# Altium footprint library 15EDGVC_VH.PcbLib: 46 footprints (part 1 of 3)
Each footprint in its own frame and in the unit in brackets; x right, y up, seen from the top. Pads: shape width x height; smd on the part's side, far side on the other; paste and mask are expansions set on the pad; w line width, h text height; cw(c..) or ccw(c..) is an arc to the next point about the centre after c.
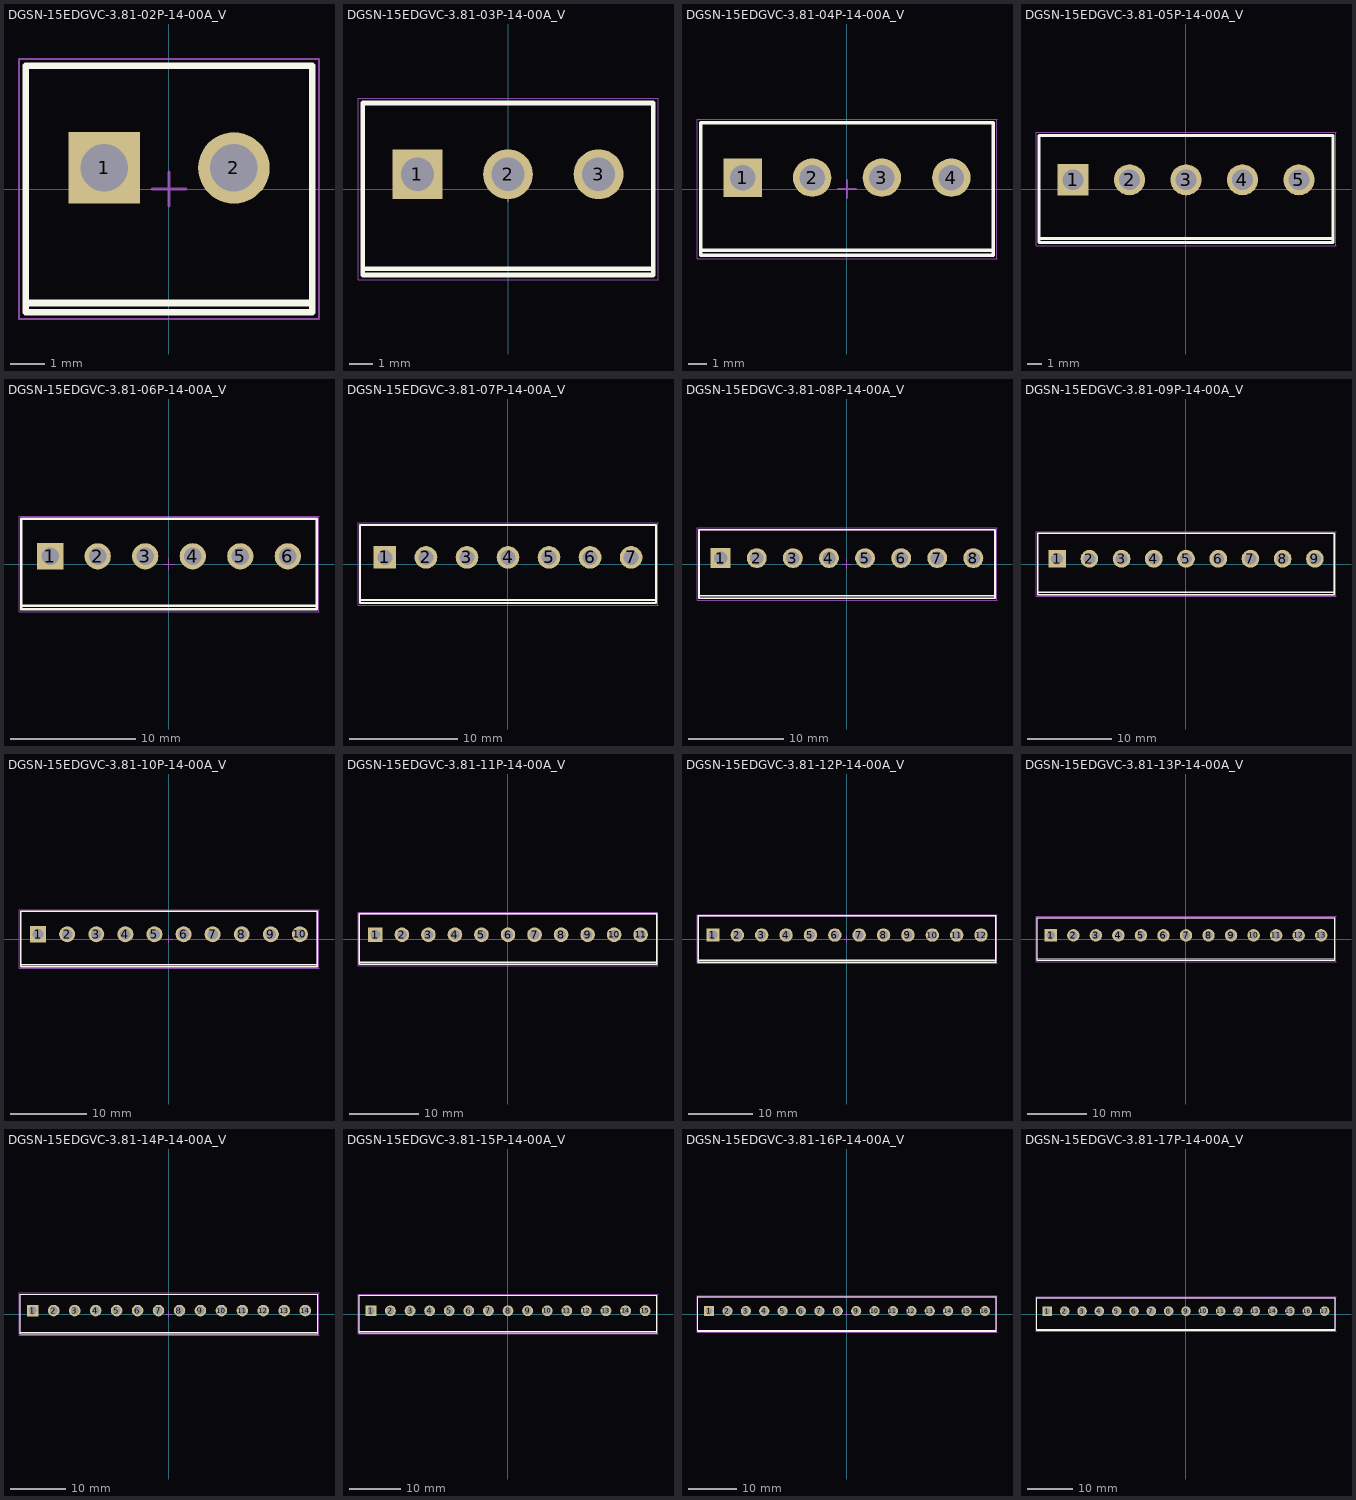
[diagram p0: the footprints below, top view; thin cyan lines are the x and y axes]

## DGSN-15EDGVC-3.81-02P-14-00A_V [mm] "Terminal Block, 2-Pin, Body 8.41x7.24mm, Pitch 3.81mm"
height 9.2
pads (2):
  rect 2.1x2.1 hole 1.4: 1(-1.905,0.62)
  round 2.1 hole 1.4: 2(1.905,0.62)
Top Overlay:
  lines w0.2: -4.205,-3.35 4.205,-3.35 ; -4.205,-3.62 -4.205,3.62 4.205,3.62 4.205,-3.62 -4.205,-3.62
Mechanical 13:
  lines w0.1: -4.205,-3.62 -4.205,3.62 4.205,3.62 4.205,-3.62 -4.205,-3.62
Mechanical 15:
  lines w0.05: -4.405,-3.82 -4.405,3.82 ; -4.405,-3.82 4.405,-3.82 4.405,3.82 -4.405,3.82
  lines w0.1: -0.5,0 0.5,0 ; 0,-0.5 0,0.5
3D body "15EDGVC-3.81-02P-14-00AH.STEP": height 9.2, standoff -3.4, extent -4.205,-3.58 4.205,3.62

## DGSN-15EDGVC-3.81-03P-14-00A_V [mm] "Terminal Block, 3-Pin, Body 12.22x7.24mm, Pitch 3.81mm"
height 9.2
pads (3):
  rect 2.1x2.1 hole 1.4: 1(-3.81,0.62)
  round 2.1 hole 1.4: 2(0,0.62) 3(3.81,0.62)
Top Overlay:
  lines w0.2: -6.11,-3.35 6.11,-3.35 ; -6.11,-3.62 6.11,-3.62 6.11,3.62 -6.11,3.62 -6.11,-3.62
Mechanical 13:
  lines w0.1: -6.11,-3.62 6.11,-3.62 6.11,3.62 -6.11,3.62 -6.11,-3.62
Mechanical 15:
  lines w0.05: -6.31,-3.82 -6.31,3.82 ; -6.31,-3.82 6.31,-3.82 6.31,3.82 -6.31,3.82
  lines w0.1: -0.5,0 0.5,0 ; 0,-0.5 0,0.5
3D body "15EDGVC-3.81-03P-14-00AH.STEP": height 9.2, standoff -3.4, extent -6.11,-3.58 6.11,3.62

## DGSN-15EDGVC-3.81-04P-14-00A_V [mm] "Terminal Block, 4-Pin, Body 16.03x7.24mm, Pitch 3.81mm"
height 9.2
pads (4):
  rect 2.1x2.1 hole 1.4: 1(-5.715,0.62)
  round 2.1 hole 1.4: 2(-1.905,0.62) 3(1.905,0.62) 4(5.715,0.62)
Top Overlay:
  lines w0.2: -8.015,-3.35 8.015,-3.35 ; -8.015,-3.62 8.015,-3.62 8.015,3.62 -8.015,3.62 -8.015,-3.62
Mechanical 13:
  lines w0.1: -8.015,-3.62 8.015,-3.62 8.015,3.62 -8.015,3.62 -8.015,-3.62
Mechanical 15:
  lines w0.05: -8.215,-3.82 -8.215,3.82 ; -8.215,-3.82 8.215,-3.82 8.215,3.82 -8.215,3.82
  lines w0.1: -0.5,0 0.5,0 ; 0,-0.5 0,0.5
3D body "15EDGVC-3.81-04P-14-00AH.STEP": height 9.2, standoff -3.4, extent -8.015,-3.58 8.015,3.62

## DGSN-15EDGVC-3.81-05P-14-00A_V [mm] "Terminal Block, 5-Pin, Body 19.84x7.24mm, Pitch 3.81mm"
height 9.2
pads (5):
  rect 2.1x2.1 hole 1.4: 1(-7.62,0.62)
  round 2.1 hole 1.4: 2(-3.81,0.62) 3(0,0.62) 4(3.81,0.62) 5(7.62,0.62)
Top Overlay:
  lines w0.2: -9.92,-3.35 9.92,-3.35 ; -9.92,-3.62 9.92,-3.62 9.92,3.62 -9.92,3.62 -9.92,-3.62
Mechanical 13:
  lines w0.1: -9.92,-3.62 9.92,-3.62 9.92,3.62 -9.92,3.62 -9.92,-3.62
Mechanical 15:
  lines w0.05: -10.12,-3.82 -10.12,3.82 ; -10.12,-3.82 10.12,-3.82 10.12,3.82 -10.12,3.82
  lines w0.1: -0.5,0 0.5,0 ; 0,-0.5 0,0.5
3D body "15EDGVC-3.81-05P-14-00AH.STEP": height 9.2, standoff -3.4, extent -9.92,-3.58 9.92,3.62

## DGSN-15EDGVC-3.81-06P-14-00A_V [mm] "Terminal Block, 6-Pin, Body 23.65x7.24mm, Pitch 3.81mm"
height 9.2
pads (6):
  rect 2.1x2.1 hole 1.4: 1(-9.525,0.62)
  round 2.1 hole 1.4: 2(-5.715,0.62) 3(-1.905,0.62) 4(1.905,0.62) 5(5.715,0.62) 6(9.525,0.62)
Top Overlay:
  lines w0.2: -11.825,-3.35 11.825,-3.35 ; -11.825,-3.62 11.825,-3.62 11.825,3.62 -11.825,3.62 -11.825,-3.62
Mechanical 13:
  lines w0.1: -11.825,-3.62 11.825,-3.62 11.825,3.62 -11.825,3.62 -11.825,-3.62
Mechanical 15:
  lines w0.05: -12.025,-3.82 -12.025,3.82 ; -12.025,-3.82 12.025,-3.82 12.025,3.82 -12.025,3.82
  lines w0.1: -0.5,0 0.5,0 ; 0,-0.5 0,0.5
3D body "15EDGVC-3.81-06P-14-00AH.STEP": height 9.2, standoff -3.4, extent -11.825,-3.58 11.825,3.62

## DGSN-15EDGVC-3.81-07P-14-00A_V [mm] "Terminal Block, 7-Pin, Body 27.46x7.24mm, Pitch 3.81mm"
height 9.2
pads (7):
  rect 2.1x2.1 hole 1.4: 1(-11.43,0.62)
  round 2.1 hole 1.4: 2(-7.62,0.62) 3(-3.81,0.62) 4(0,0.62) 5(3.81,0.62) 6(7.62,0.62) 7(11.43,0.62)
Top Overlay:
  lines w0.2: -13.73,-3.35 13.73,-3.35 ; -13.73,-3.62 13.73,-3.62 13.73,3.62 -13.73,3.62 -13.73,-3.62
Mechanical 13:
  lines w0.1: -13.73,-3.62 13.73,-3.62 13.73,3.62 -13.73,3.62 -13.73,-3.62
Mechanical 15:
  lines w0.05: -13.93,-3.82 -13.93,3.82 ; -13.93,-3.82 13.93,-3.82 13.93,3.82 -13.93,3.82
  lines w0.1: -0.5,0 0.5,0 ; 0,-0.5 0,0.5
3D body "15EDGVC-3.81-07P-14-00AH.STEP": height 9.2, standoff -3.4, extent -13.73,-3.58 13.73,3.62

## DGSN-15EDGVC-3.81-08P-14-00A_V [mm] "Terminal Block, 8-Pin, Body 31.27x7.24mm, Pitch 3.81mm"
height 9.2
pads (8):
  rect 2.1x2.1 hole 1.4: 1(-13.335,0.62)
  round 2.1 hole 1.4: 2(-9.525,0.62) 3(-5.715,0.62) 4(-1.905,0.62) 5(1.905,0.62) 6(5.715,0.62) 7(9.525,0.62) 8(13.335,0.62)
Top Overlay:
  lines w0.2: -15.635,-3.35 15.635,-3.35 ; -15.635,-3.62 15.635,-3.62 15.635,3.62 -15.635,3.62 -15.635,-3.62
Mechanical 13:
  lines w0.1: -15.635,-3.62 15.635,-3.62 15.635,3.62 -15.635,3.62 -15.635,-3.62
Mechanical 15:
  lines w0.05: -15.835,-3.82 -15.835,3.82 ; -15.835,-3.82 15.835,-3.82 15.835,3.82 -15.835,3.82
  lines w0.1: -0.5,0 0.5,0 ; 0,-0.5 0,0.5
3D body "15EDGVC-3.81-08P-14-00AH.STEP": height 9.2, standoff -3.4, extent -15.635,-3.58 15.635,3.62

## DGSN-15EDGVC-3.81-09P-14-00A_V [mm] "Terminal Block, 9-Pin, Body 35.08x7.24mm, Pitch 3.81mm"
height 9.2
pads (9):
  rect 2.1x2.1 hole 1.4: 1(-15.24,0.62)
  round 2.1 hole 1.4: 2(-11.43,0.62) 3(-7.62,0.62) 4(-3.81,0.62) 5(0,0.62) 6(3.81,0.62) 7(7.62,0.62) 8(11.43,0.62) 9(15.24,0.62)
Top Overlay:
  lines w0.2: -17.54,-3.35 17.54,-3.35 ; -17.54,-3.62 17.54,-3.62 17.54,3.62 -17.54,3.62 -17.54,-3.62
Mechanical 13:
  lines w0.1: -17.54,-3.62 17.54,-3.62 17.54,3.62 -17.54,3.62 -17.54,-3.62
Mechanical 15:
  lines w0.05: -17.74,-3.82 -17.74,3.82 ; -17.74,-3.82 17.74,-3.82 17.74,3.82 -17.74,3.82
  lines w0.1: -0.5,0 0.5,0 ; 0,-0.5 0,0.5
3D body "15EDGVC-3.81-09P-14-00AH.STEP": height 9.2, standoff -3.4, extent -17.54,-3.58 17.54,3.62

## DGSN-15EDGVC-3.81-10P-14-00A_V [mm] "Terminal Block, 10-Pin, Body 38.89x7.24mm, Pitch 3.81mm"
height 9.2
pads (10):
  rect 2.1x2.1 hole 1.4: 1(-17.145,0.62)
  round 2.1 hole 1.4: 2(-13.335,0.62) 3(-9.525,0.62) 4(-5.715,0.62) 5(-1.905,0.62) 6(1.905,0.62) 7(5.715,0.62) 8(9.525,0.62) 9(13.335,0.62) 10(17.145,0.62)
Top Overlay:
  lines w0.2: -19.445,-3.35 19.445,-3.35 ; -19.445,-3.62 19.445,-3.62 19.445,3.62 -19.445,3.62 -19.445,-3.62
Mechanical 13:
  lines w0.1: -19.445,-3.62 19.445,-3.62 19.445,3.62 -19.445,3.62 -19.445,-3.62
Mechanical 15:
  lines w0.05: -19.645,-3.82 -19.645,3.82 ; -19.645,-3.82 19.645,-3.82 19.645,3.82 -19.645,3.82
  lines w0.1: -0.5,0 0.5,0 ; 0,-0.5 0,0.5
3D body "15EDGVC-3.81-10P-14-00AH.STEP": height 9.2, standoff -3.4, extent -19.445,-3.58 19.445,3.62

## DGSN-15EDGVC-3.81-11P-14-00A_V [mm] "Terminal Block, 11-Pin, Body 42.70x7.24mm, Pitch 3.81mm"
height 9.2
pads (11):
  rect 2.1x2.1 hole 1.4: 1(-19.05,0.62)
  round 2.1 hole 1.4: 2(-15.24,0.62) 3(-11.43,0.62) 4(-7.62,0.62) 5(-3.81,0.62) 6(0,0.62) 7(3.81,0.62) 8(7.62,0.62) 9(11.43,0.62) 10(15.24,0.62) 11(19.05,0.62)
Top Overlay:
  lines w0.2: -21.35,-3.35 21.35,-3.35 ; -21.35,-3.62 21.35,-3.62 21.35,3.62 -21.35,3.62 -21.35,-3.62
Mechanical 13:
  lines w0.1: -21.35,-3.62 21.35,-3.62 21.35,3.62 -21.35,3.62 -21.35,-3.62
Mechanical 15:
  lines w0.05: -21.55,-3.82 -21.55,3.82 ; -21.55,-3.82 21.55,-3.82 21.55,3.82 -21.55,3.82
  lines w0.1: -0.5,0 0.5,0 ; 0,-0.5 0,0.5
3D body "15EDGVC-3.81-11P-14-00AH.STEP": height 9.2, standoff -3.4, extent -21.35,-3.58 21.35,3.62

## DGSN-15EDGVC-3.81-12P-14-00A_V [mm] "Terminal Block, 12-Pin, Body 46.51x7.24mm, Pitch 3.81mm"
height 9.2
pads (12):
  rect 2.1x2.1 hole 1.4: 1(-20.955,0.62)
  round 2.1 hole 1.4: 2(-17.145,0.62) 3(-13.335,0.62) 4(-9.525,0.62) 5(-5.715,0.62) 6(-1.905,0.62) 7(1.905,0.62) 8(5.715,0.62) 9(9.525,0.62) 10(13.335,0.62) 11(17.145,0.62) 12(20.955,0.62)
Top Overlay:
  lines w0.2: -23.255,-3.35 23.255,-3.35 ; -23.255,-3.62 23.255,-3.62 23.255,3.62 -23.255,3.62 -23.255,-3.62
Mechanical 13:
  lines w0.1: -23.255,-3.62 23.255,-3.62 23.255,3.62 -23.255,3.62 -23.255,-3.62
Mechanical 15:
  lines w0.05: -23.455,-3.82 -23.455,3.82 ; -23.455,-3.82 23.455,-3.82 23.455,3.82 -23.455,3.82
  lines w0.1: -0.5,0 0.5,0 ; 0,-0.5 0,0.5
3D body "15EDGVC-3.81-12P-14-00AH.STEP": height 9.2, standoff -3.4, extent -23.255,-3.58 23.255,3.62

## DGSN-15EDGVC-3.81-13P-14-00A_V [mm] "Terminal Block, 13-Pin, Body 50.32x7.24mm, Pitch 3.81mm"
height 9.2
pads (13):
  rect 2.1x2.1 hole 1.4: 1(-22.86,0.62)
  round 2.1 hole 1.4: 2(-19.05,0.62) 3(-15.24,0.62) 4(-11.43,0.62) 5(-7.62,0.62) 6(-3.81,0.62) 7(0,0.62) 8(3.81,0.62) 9(7.62,0.62) 10(11.43,0.62) 11(15.24,0.62) 12(19.05,0.62) 13(22.86,0.62)
Top Overlay:
  lines w0.2: -25.16,-3.35 25.16,-3.35 ; -25.16,-3.62 25.16,-3.62 25.16,3.62 -25.16,3.62 -25.16,-3.62
Mechanical 13:
  lines w0.1: -25.16,-3.62 25.16,-3.62 25.16,3.62 -25.16,3.62 -25.16,-3.62
Mechanical 15:
  lines w0.05: -25.36,-3.82 -25.36,3.82 ; -25.36,-3.82 25.36,-3.82 25.36,3.82 -25.36,3.82
  lines w0.1: -0.5,0 0.5,0 ; 0,-0.5 0,0.5
3D body "15EDGVC-3.81-13P-14-00AH.STEP": height 9.2, standoff -3.4, extent -25.16,-3.58 25.16,3.62

## DGSN-15EDGVC-3.81-14P-14-00A_V [mm] "Terminal Block, 14-Pin, Body 54.13x7.24mm, Pitch 3.81mm"
height 9.2
pads (14):
  rect 2.1x2.1 hole 1.4: 1(-24.765,0.62)
  round 2.1 hole 1.4: 2(-20.955,0.62) 3(-17.145,0.62) 4(-13.335,0.62) 5(-9.525,0.62) 6(-5.715,0.62) 7(-1.905,0.62) 8(1.905,0.62) 9(5.715,0.62) 10(9.525,0.62) 11(13.335,0.62) 12(17.145,0.62) 13(20.955,0.62) 14(24.765,0.62)
Top Overlay:
  lines w0.2: -27.065,-3.35 27.065,-3.35 ; -27.065,-3.62 27.065,-3.62 27.065,3.62 -27.065,3.62 -27.065,-3.62
Mechanical 13:
  lines w0.1: -27.065,-3.62 27.065,-3.62 27.065,3.62 -27.065,3.62 -27.065,-3.62
Mechanical 15:
  lines w0.05: -27.265,-3.82 -27.265,3.82 ; -27.265,-3.82 27.265,-3.82 27.265,3.82 -27.265,3.82
  lines w0.1: -0.5,0 0.5,0 ; 0,-0.5 0,0.5
3D body "15EDGVC-3.81-14P-14-00AH.STEP": height 9.2, standoff -3.4, extent -27.065,-3.58 27.065,3.62

## DGSN-15EDGVC-3.81-15P-14-00A_V [mm] "Terminal Block, 15-Pin, Body 57.94x7.24mm, Pitch 3.81mm"
height 9.2
pads (15):
  rect 2.1x2.1 hole 1.4: 1(-26.67,0.62)
  round 2.1 hole 1.4: 2(-22.86,0.62) 3(-19.05,0.62) 4(-15.24,0.62) 5(-11.43,0.62) 6(-7.62,0.62) 7(-3.81,0.62) 8(0,0.62) 9(3.81,0.62) 10(7.62,0.62) 11(11.43,0.62) 12(15.24,0.62) 13(19.05,0.62) 14(22.86,0.62) 15(26.67,0.62)
Top Overlay:
  lines w0.2: -28.97,-3.35 28.97,-3.35 ; -28.97,-3.62 28.97,-3.62 28.97,3.62 -28.97,3.62 -28.97,-3.62
Mechanical 13:
  lines w0.1: -28.97,-3.62 28.97,-3.62 28.97,3.62 -28.97,3.62 -28.97,-3.62
Mechanical 15:
  lines w0.05: -29.17,-3.82 -29.17,3.82 ; -29.17,-3.82 29.17,-3.82 29.17,3.82 -29.17,3.82
  lines w0.1: -0.5,0 0.5,0 ; 0,-0.5 0,0.5
3D body "15EDGVC-3.81-15P-14-00AH.STEP": height 9.2, standoff -3.4, extent -28.97,-3.58 28.97,3.62

## DGSN-15EDGVC-3.81-16P-14-00A_V [mm] "Terminal Block, 16-Pin, Body 61.75x7.24mm, Pitch 3.81mm"
height 9.2
pads (16):
  rect 2.1x2.1 hole 1.4: 1(-28.575,0.62)
  round 2.1 hole 1.4: 2(-24.765,0.62) 3(-20.955,0.62) 4(-17.145,0.62) 5(-13.335,0.62) 6(-9.525,0.62) 7(-5.715,0.62) 8(-1.905,0.62) 9(1.905,0.62) 10(5.715,0.62) 11(9.525,0.62) 12(13.335,0.62) 13(17.145,0.62) 14(20.955,0.62) 15(24.765,0.62) 16(28.575,0.62)
Top Overlay:
  lines w0.2: -30.875,-3.35 30.875,-3.35 ; -30.875,-3.62 30.875,-3.62 30.875,3.62 -30.875,3.62 -30.875,-3.62
Mechanical 13:
  lines w0.1: -30.875,-3.62 30.875,-3.62 30.875,3.62 -30.875,3.62 -30.875,-3.62
Mechanical 15:
  lines w0.05: -31.075,-3.82 -31.075,3.82 ; -31.075,-3.82 31.075,-3.82 31.075,3.82 -31.075,3.82
  lines w0.1: -0.5,0 0.5,0 ; 0,-0.5 0,0.5
3D body "15EDGVC-3.81-16P-14-00AH.STEP": height 9.2, standoff -3.4, extent -30.875,-3.58 30.875,3.62

## DGSN-15EDGVC-3.81-17P-14-00A_V [mm] "Terminal Block, 17-Pin, Body 65.56x7.24mm, Pitch 3.81mm"
height 9.2
pads (17):
  rect 2.1x2.1 hole 1.4: 1(-30.48,0.62)
  round 2.1 hole 1.4: 2(-26.67,0.62) 3(-22.86,0.62) 4(-19.05,0.62) 5(-15.24,0.62) 6(-11.43,0.62) 7(-7.62,0.62) 8(-3.81,0.62) 9(0,0.62) 10(3.81,0.62) 11(7.62,0.62) 12(11.43,0.62) 13(15.24,0.62) 14(19.05,0.62) 15(22.86,0.62) 16(26.67,0.62) 17(30.48,0.62)
Top Overlay:
  lines w0.2: -32.78,-3.35 32.78,-3.35 ; -32.78,-3.62 32.78,-3.62 32.78,3.62 -32.78,3.62 -32.78,-3.62
Mechanical 13:
  lines w0.1: -32.78,-3.62 32.78,-3.62 32.78,3.62 -32.78,3.62 -32.78,-3.62
Mechanical 15:
  lines w0.05: -32.98,-3.82 -32.98,3.82 ; -32.98,-3.82 32.98,-3.82 32.98,3.82 -32.98,3.82
  lines w0.1: -0.5,0 0.5,0 ; 0,-0.5 0,0.5
3D body "15EDGVC-3.81-17P-14-00AH.STEP": height 9.2, standoff -3.4, extent -32.78,-3.58 32.78,3.62